# Altium footprint library fszhang.PcbLib: 1032 footprints (part 61 of 66)
Each footprint in its own frame and in the unit in brackets; x right, y up, seen from the top. Pads: shape width x height; smd on the part's side, far side on the other; paste and mask are expansions set on the pad; w line width, h text height; cw(c..) or ccw(c..) is an arc to the next point about the centre after c.
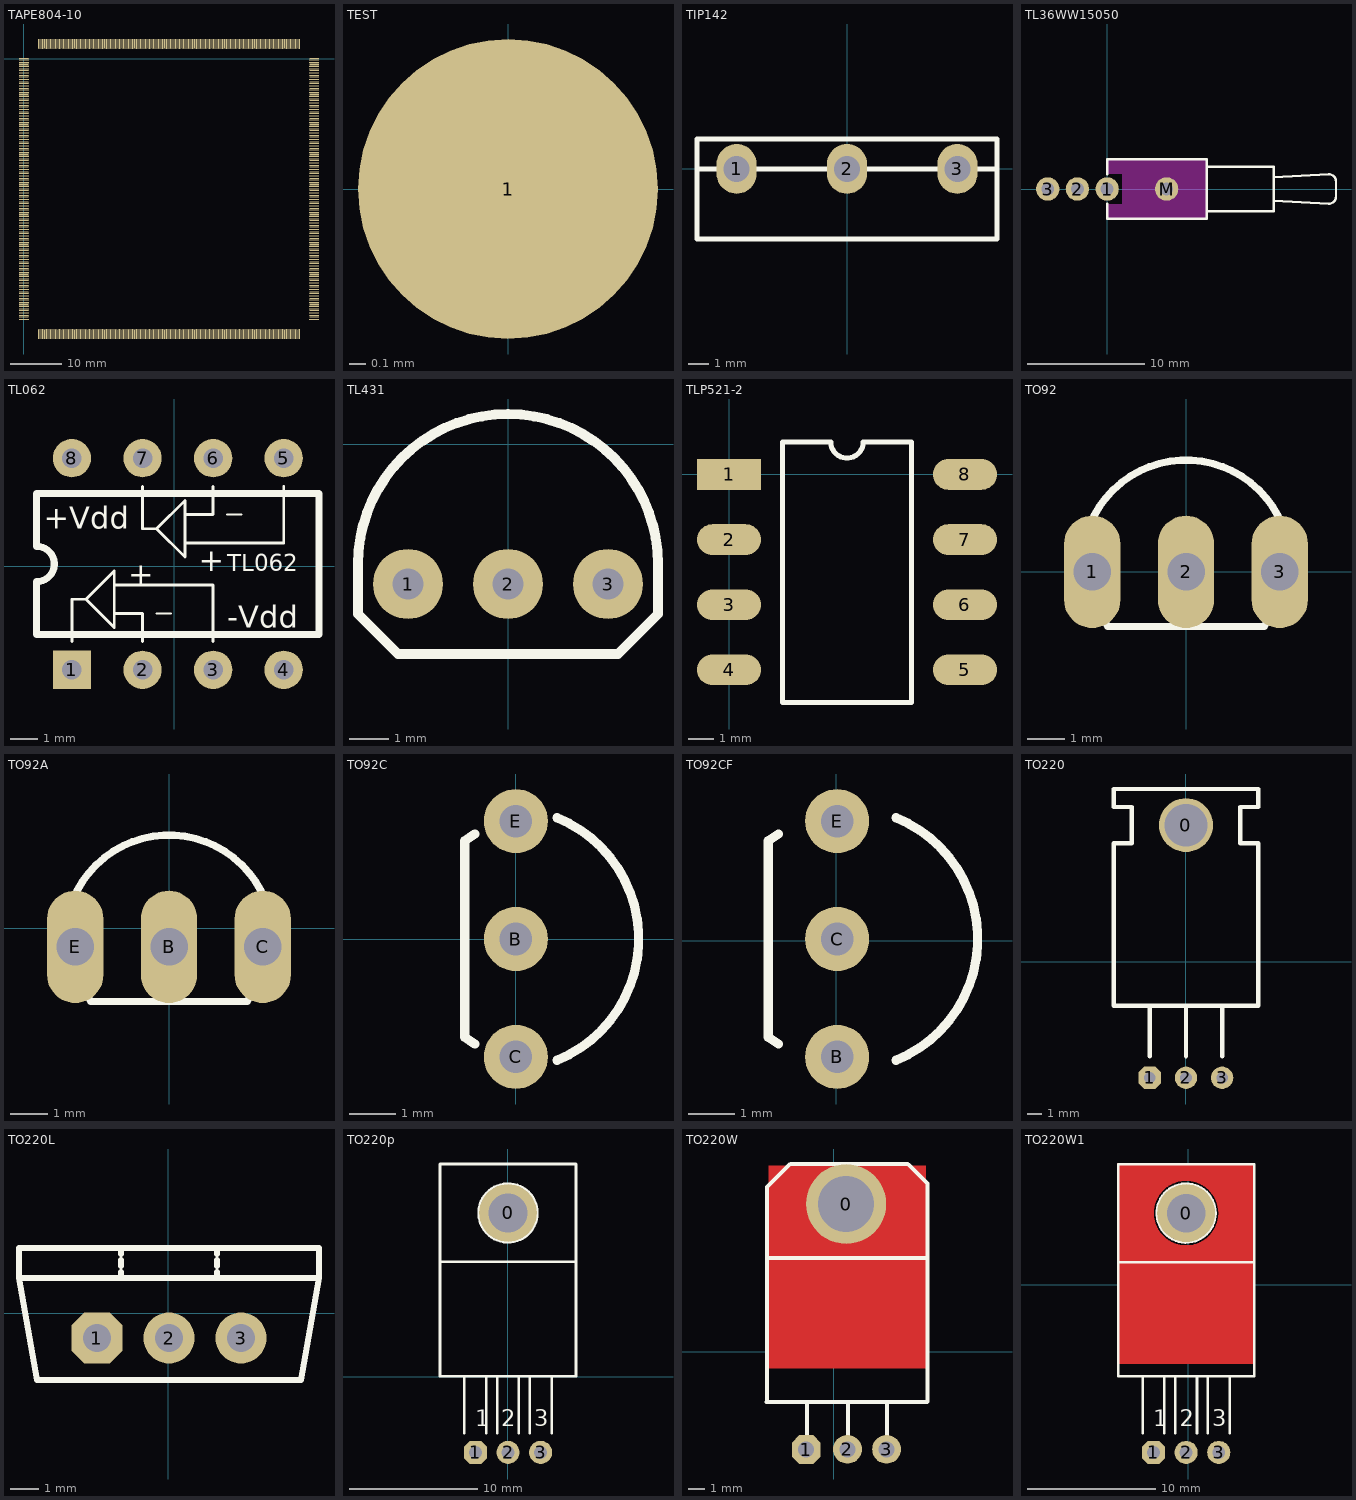
[diagram p60: the footprints below, top view; thin cyan lines are the x and y axes]

## TAPE804-10 [mil]
pads (804):
  oval 75x5 smd: 1(0,0) 2(0,-10) 3(0,-20) 4(0,-30) 5(0,-40) 6(0,-50) 7(0,-60) 8(0,-70) 9(0,-80) 10(0,-90) 11(0,-100) 12(0,-110) 13(0,-120) 14(0,-130) 15(0,-140) 16(0,-150) 17(0,-160) 18(0,-170) 19(0,-180) 20(0,-190) 21(0,-200) 22(0,-210) 23(0,-220) 24(0,-230) 25(0,-240) 26(0,-250) 27(0,-260) 28(0,-270) 29(0,-280) 30(0,-290) 31(0,-300) 32(0,-310) 33(0,-320) 34(0,-330) 35(0,-340) 36(0,-350) 37(0,-360) 38(0,-370) 39(0,-380) 40(0,-390) 41(0,-400) 42(0,-410) 43(0,-420) 44(0,-430) 45(0,-440) 46(0,-450) 47(0,-460) 48(0,-470) 49(0,-480) 50(0,-490) 51(0,-500) 52(0,-510) 53(0,-520) 54(0,-530) 55(0,-540) 56(0,-550) 57(0,-560) 58(0,-570) 59(0,-580) 60(0,-590) 61(0,-600) 62(0,-610) 63(0,-620) 64(0,-630) 65(0,-640) 66(0,-650) 67(0,-660) 68(0,-670) 69(0,-680) 70(0,-690) 71(0,-700) 72(0,-710) 73(0,-720) 74(0,-730) 75(0,-740) 76(0,-750) 77(0,-760) 78(0,-770) 79(0,-780) 80(0,-790) 81(0,-800) 82(0,-810) 83(0,-820) 84(0,-830) 85(0,-840) 86(0,-850) 87(0,-860) 88(0,-870) 89(0,-880) 90(0,-890) 91(0,-900) 92(0,-910) 93(0,-920) 94(0,-930) 95(0,-940) 96(0,-950) 97(0,-960) 98(0,-970) 99(0,-980) 100(0,-990) 101(0,-1000) 102(0,-1010) 103(0,-1020) 104(0,-1030) 105(0,-1040) 106(0,-1050) 107(0,-1060) 108(0,-1070) 109(0,-1080) 110(0,-1090) 111(0,-1100) 112(0,-1110) 113(0,-1120) 114(0,-1130) 115(0,-1140) 116(0,-1150) 117(0,-1160) 118(0,-1170) 119(0,-1180) 120(0,-1190) 121(0,-1200) 122(0,-1210) 123(0,-1220) 124(0,-1230) 125(0,-1240) 126(0,-1250) 127(0,-1260) 128(0,-1270) 129(0,-1280) 130(0,-1290) 131(0,-1300) 132(0,-1310) 133(0,-1320) 134(0,-1330) 135(0,-1340) 136(0,-1350) 137(0,-1360) 138(0,-1370) 139(0,-1380) 140(0,-1390) 141(0,-1400) 142(0,-1410) 143(0,-1420) 144(0,-1430) 145(0,-1440) 146(0,-1450) 147(0,-1460) 148(0,-1470) 149(0,-1480) 150(0,-1490) 151(0,-1500) 152(0,-1510) 153(0,-1520) 154(0,-1530) 155(0,-1540) 156(0,-1550) 157(0,-1560) 158(0,-1570) 159(0,-1580) 160(0,-1590) 161(0,-1600) 162(0,-1610) 163(0,-1620) 164(0,-1630) 165(0,-1640) 166(0,-1650) 167(0,-1660) 168(0,-1670) 169(0,-1680) 170(0,-1690) 171(0,-1700) 172(0,-1710) 173(0,-1720) 174(0,-1730) 175(0,-1740) 176(0,-1750) 177(0,-1760) 178(0,-1770) 179(0,-1780) 180(0,-1790) 181(0,-1800) 182(0,-1810) 183(0,-1820) 184(0,-1830) 185(0,-1840) 186(0,-1850) 187(0,-1860) 188(0,-1870) 189(0,-1880) 190(0,-1890) 191(0,-1900) 192(0,-1910) 193(0,-1920) 194(0,-1930) 195(0,-1940) 196(0,-1950) 197(0,-1960) 198(0,-1970) 199(0,-1980) 200(0,-1990) 201(0,-2000) 403(2225,-2000) 404(2225,-1990) 405(2225,-1980) 406(2225,-1970) 407(2225,-1960) 408(2225,-1950) 409(2225,-1940) 410(2225,-1930) 411(2225,-1920) 412(2225,-1910) 413(2225,-1900) 414(2225,-1890) 415(2225,-1880) 416(2225,-1870) 417(2225,-1860) 418(2225,-1850) 419(2225,-1840) 420(2225,-1830) 421(2225,-1820) 422(2225,-1810) 423(2225,-1800) 424(2225,-1790) 425(2225,-1780) 426(2225,-1770) 427(2225,-1760) 428(2225,-1750) 429(2225,-1740) 430(2225,-1730) 431(2225,-1720) 432(2225,-1710) 433(2225,-1700) 434(2225,-1690) 435(2225,-1680) 436(2225,-1670) 437(2225,-1660) 438(2225,-1650) 439(2225,-1640) 440(2225,-1630) 441(2225,-1620) 442(2225,-1610) 443(2225,-1600) 444(2225,-1590) 445(2225,-1580) 446(2225,-1570) 447(2225,-1560) 448(2225,-1550) 449(2225,-1540) 450(2225,-1530) 451(2225,-1520) 452(2225,-1510) 453(2225,-1500) 454(2225,-1490) 455(2225,-1480) 456(2225,-1470) 457(2225,-1460) 458(2225,-1450) 459(2225,-1440) 460(2225,-1430) 461(2225,-1420) 462(2225,-1410) 463(2225,-1400) 464(2225,-1390) 465(2225,-1380) 466(2225,-1370) 467(2225,-1360) 468(2225,-1350) 469(2225,-1340) 470(2225,-1330) 471(2225,-1320) 472(2225,-1310) 473(2225,-1300) 474(2225,-1290) 475(2225,-1280) 476(2225,-1270) 477(2225,-1260) 478(2225,-1250) 479(2225,-1240) 480(2225,-1230) 481(2225,-1220) 482(2225,-1210) 483(2225,-1200) 484(2225,-1190) 485(2225,-1180) 486(2225,-1170) 487(2225,-1160) 488(2225,-1150) 489(2225,-1140) 490(2225,-1130) 491(2225,-1120) 492(2225,-1110) 493(2225,-1100) 494(2225,-1090) 495(2225,-1080) 496(2225,-1070) 497(2225,-1060) 498(2225,-1050) 499(2225,-1040) 500(2225,-1030) 501(2225,-1020) 502(2225,-1010) 503(2225,-1000) 504(2225,-990) 505(2225,-980) 506(2225,-970) 507(2225,-960) 508(2225,-950) 509(2225,-940) 510(2225,-930) 511(2225,-920) 512(2225,-910) 513(2225,-900) 514(2225,-890) 515(2225,-880) 516(2225,-870) 517(2225,-860) 518(2225,-850) 519(2225,-840) 520(2225,-830) 521(2225,-820) 522(2225,-810) 523(2225,-800) 524(2225,-790) 525(2225,-780) 526(2225,-770) 527(2225,-760) 528(2225,-750) 529(2225,-740) 530(2225,-730) 531(2225,-720) 532(2225,-710) 533(2225,-700) 534(2225,-690) 535(2225,-680) 536(2225,-670) 537(2225,-660) 538(2225,-650) 539(2225,-640) 540(2225,-630) 541(2225,-620) 542(2225,-610) 543(2225,-600) 544(2225,-590) 545(2225,-580) 546(2225,-570) 547(2225,-560) 548(2225,-550) 549(2225,-540) 550(2225,-530) 551(2225,-520) 552(2225,-510) 553(2225,-500) 554(2225,-490) 555(2225,-480) 556(2225,-470) 557(2225,-460) 558(2225,-450) 559(2225,-440) 560(2225,-430) 561(2225,-420) 562(2225,-410) 563(2225,-400) 564(2225,-390) 565(2225,-380) 566(2225,-370) 567(2225,-360) 568(2225,-350) 569(2225,-340) 570(2225,-330) 571(2225,-320) 572(2225,-310) 573(2225,-300) 574(2225,-290) 575(2225,-280) 576(2225,-270) 577(2225,-260) 578(2225,-250) 579(2225,-240) 580(2225,-230) 581(2225,-220) 582(2225,-210) 583(2225,-200) 584(2225,-190) 585(2225,-180) 586(2225,-170) 587(2225,-160) 588(2225,-150) 589(2225,-140) 590(2225,-130) 591(2225,-120) 592(2225,-110) 593(2225,-100) 594(2225,-90) 595(2225,-80) 596(2225,-70) 597(2225,-60) 598(2225,-50) 599(2225,-40) 600(2225,-30) 601(2225,-20) 602(2225,-10) 603(2225,0)
  oval 5x75 smd: 202(113,-2112) 203(123,-2112) 204(133,-2112) 205(143,-2112) 206(153,-2112) 207(163,-2112) 208(173,-2112) 209(183,-2112) 210(193,-2112) 211(203,-2112) 212(213,-2112) 213(223,-2112) 214(233,-2112) 215(243,-2112) 216(253,-2112) 217(263,-2112) 218(273,-2112) 219(283,-2112) 220(293,-2112) 221(303,-2112) 222(313,-2112) 223(323,-2112) 224(333,-2112) 225(343,-2112) 226(353,-2112) 227(363,-2112) 228(373,-2112) 229(383,-2112) 230(393,-2112) 231(403,-2112) 232(413,-2112) 233(423,-2112) 234(433,-2112) 235(443,-2112) 236(453,-2112) 237(463,-2112) 238(473,-2112) 239(483,-2112) 240(493,-2112) 241(503,-2112) 242(513,-2112) 243(523,-2112) 244(533,-2112) 245(543,-2112) 246(553,-2112) 247(563,-2112) 248(573,-2112) 249(583,-2112) 250(593,-2112) 251(603,-2112) 252(613,-2112) 253(623,-2112) 254(633,-2112) 255(643,-2112) 256(653,-2112) 257(663,-2112) 258(673,-2112) 259(683,-2112) 260(693,-2112) 261(703,-2112) 262(713,-2112) 263(723,-2112) 264(733,-2112) 265(743,-2112) 266(753,-2112) 267(763,-2112) 268(773,-2112) 269(783,-2112) 270(793,-2112) 271(803,-2112) 272(813,-2112) 273(823,-2112) 274(833,-2112) 275(843,-2112) 276(853,-2112) 277(863,-2112) 278(873,-2112) 279(883,-2112) 280(893,-2112) 281(903,-2112) 282(913,-2112) 283(923,-2112) 284(933,-2112) 285(943,-2112) 286(953,-2112) 287(963,-2112) 288(973,-2112) 289(983,-2112) 290(993,-2112) 291(1003,-2112) 292(1013,-2112) 293(1023,-2112) 294(1033,-2112) 295(1043,-2112) 296(1053,-2112) 297(1063,-2112) 298(1073,-2112) 299(1083,-2112) 300(1093,-2112) 301(1103,-2112) 302(1113,-2112) 303(1123,-2112) 304(1133,-2112) 305(1143,-2112) 306(1153,-2112) 307(1163,-2112) 308(1173,-2112) 309(1183,-2112) 310(1193,-2112) 311(1203,-2112) 312(1213,-2112) 313(1223,-2112) 314(1233,-2112) 315(1243,-2112) 316(1253,-2112) 317(1263,-2112) 318(1273,-2112) 319(1283,-2112) 320(1293,-2112) 321(1303,-2112) 322(1313,-2112) 323(1323,-2112) 324(1333,-2112) 325(1343,-2112) 326(1353,-2112) 327(1363,-2112) 328(1373,-2112) 329(1383,-2112) 330(1393,-2112) 331(1403,-2112) 332(1413,-2112) 333(1423,-2112) 334(1433,-2112) 335(1443,-2112) 336(1453,-2112) 337(1463,-2112) 338(1473,-2112) 339(1483,-2112) 340(1493,-2112) 341(1503,-2112) 342(1513,-2112) 343(1523,-2112) 344(1533,-2112) 345(1543,-2112) 346(1553,-2112) 347(1563,-2112) 348(1573,-2112) 349(1583,-2112) 350(1593,-2112) 351(1603,-2112) 352(1613,-2112) 353(1623,-2112) 354(1633,-2112) 355(1643,-2112) 356(1653,-2112) 357(1663,-2112) 358(1673,-2112) 359(1683,-2112) 360(1693,-2112) 361(1703,-2112) 362(1713,-2112) 363(1723,-2112) 364(1733,-2112) 365(1743,-2112) 366(1753,-2112) 367(1763,-2112) 368(1773,-2112) 369(1783,-2112) 370(1793,-2112) 371(1803,-2112) 372(1813,-2112) 373(1823,-2112) 374(1833,-2112) 375(1843,-2112) 376(1853,-2112) 377(1863,-2112) 378(1873,-2112) 379(1883,-2112) 380(1893,-2112) 381(1903,-2112) 382(1913,-2112) 383(1923,-2112) 384(1933,-2112) 385(1943,-2112) 386(1953,-2112) 387(1963,-2112) 388(1973,-2112) 389(1983,-2112) 390(1993,-2112) 391(2003,-2112) 392(2013,-2112) 393(2023,-2112) 394(2033,-2112) 395(2043,-2112) 396(2053,-2112) 397(2063,-2112) 398(2073,-2112) 399(2083,-2112) 400(2093,-2112) 401(2103,-2112) 402(2113,-2112) 604(2113,113) 605(2103,113) 606(2093,113) 607(2083,113) 608(2073,113) 609(2063,113) 610(2053,113) 611(2043,113) 612(2033,113) 613(2023,113) 614(2013,113) 615(2003,113) 616(1993,113) 617(1983,113) 618(1973,113) 619(1963,113) 620(1953,113) 621(1943,113) 622(1933,113) 623(1923,113) 624(1913,113) 625(1903,113) 626(1893,113) 627(1883,113) 628(1873,113) 629(1863,113) 630(1853,113) 631(1843,113) 632(1833,113) 633(1823,113) 634(1813,113) 635(1803,113) 636(1793,113) 637(1783,113) 638(1773,113) 639(1763,113) 640(1753,113) 641(1743,113) 642(1733,113) 643(1723,113) 644(1713,113) 645(1703,113) 646(1693,113) 647(1683,113) 648(1673,113) 649(1663,113) 650(1653,113) 651(1643,113) 652(1633,113) 653(1623,113) 654(1613,113) 655(1603,113) 656(1593,113) 657(1583,113) 658(1573,113) 659(1563,113) 660(1553,113) 661(1543,113) 662(1533,113) 663(1523,113) 664(1513,113) 665(1503,113) 666(1493,113) 667(1483,113) 668(1473,113) 669(1463,113) 670(1453,113) 671(1443,113) 672(1433,113) 673(1423,113) 674(1413,113) 675(1403,113) 676(1393,113) 677(1383,113) 678(1373,113) 679(1363,113) 680(1353,113) 681(1343,113) 682(1333,113) 683(1323,113) 684(1313,113) 685(1303,113) 686(1293,113) 687(1283,113) 688(1273,113) 689(1263,113) 690(1253,113) 691(1243,113) 692(1233,113) 693(1223,113) 694(1213,113) 695(1203,113) 696(1193,113) 697(1183,113) 698(1173,113) 699(1163,113) 700(1153,113) 701(1143,113) 702(1133,113) 703(1123,113) 704(1113,113) 705(1103,113) 706(1093,113) 707(1083,113) 708(1073,113) 709(1063,113) 710(1053,113) 711(1043,113) 712(1033,113) 713(1023,113) 714(1013,113) 715(1003,113) 716(993,113) 717(983,113) 718(973,113) 719(963,113) 720(953,113) 721(943,113) 722(933,113) 723(923,113) 724(913,113) 725(903,113) 726(893,113) 727(883,113) 728(873,113) 729(863,113) 730(853,113) 731(843,113) 732(833,113) 733(823,113) 734(813,113) 735(803,113) 736(793,113) 737(783,113) 738(773,113) 739(763,113) 740(753,113) 741(743,113) 742(733,113) 743(723,113) 744(713,113) 745(703,113) 746(693,113) 747(683,113) 748(673,113) 749(663,113) 750(653,113) 751(643,113) 752(633,113) 753(623,113) 754(613,113) 755(603,113) 756(593,113) 757(583,113) 758(573,113) 759(563,113) 760(553,113) 761(543,113) 762(533,113) 763(523,113) 764(513,113) 765(503,113) 766(493,113) 767(483,113) 768(473,113) 769(463,113) 770(453,113) 771(443,113) 772(433,113) 773(423,113) 774(413,113) 775(403,113) 776(393,113) 777(383,113) 778(373,113) 779(363,113) 780(353,113) 781(343,113) 782(333,113) 783(323,113) 784(313,113) 785(303,113) 786(293,113) 787(283,113) 788(273,113) 789(263,113) 790(253,113) 791(243,113) 792(233,113) 793(223,113) 794(213,113) 795(203,113) 796(193,113) 797(183,113) 798(173,113) 799(163,113) 800(153,113) 801(143,113) 802(133,113) 803(123,113) 804(113,113)

## TEST [mil]
pads (1):
  round 70 smd: 1(0,0)

## TIP142 [mil]
pads (3):
  oval 79x98 hole 51: 1(-217,0) 2(0,0) 3(217,0)
Top Overlay:
  lines w10: -295,0 295,0 ; -295,-138 -295,59 295,59 295,-138 -295,-138

## TL36WW15050 [mm] "SPDT Subminiature Toggle Switch, Right Angle Mounting, Vertical Actuation"
pads (4):
  round 2 hole 1.1: 1(0,0) 2(-2.54,0) 3(-5.08,0) M(5.08,0)
Top Layer keep-out:
  region: 1.27,2.54 1.27,-2.54 8.509,-2.54 8.509,2.54
  region: 0,2.54 0,1.27 1.27,1.27 1.27,2.54
  region: 0,-1.27 0,-2.54 1.27,-2.54 1.27,-1.27
Top Overlay:
  lines w0.2: 0,-1.27 0,-2.54 8.509,-2.54 8.509,2.54 0,2.54 0,1.27 ; 8.509,-1.905 14.224,-1.905 14.224,1.905 8.509,1.905 ; 14.224,-1.016 18.923,-1.27 ccw(c18.923,-0.635) 19.558,-0.635 19.558,0.635 ccw(c18.923,0.635) 18.923,1.27 14.224,1.016

## TL062 [mm]
pads (8):
  rect 1.38x1.38 hole 0.7: 1(-3.676,-3.723)
  round 1.38 hole 0.7: 2(-1.136,-3.723) 3(1.404,-3.723) 4(3.944,-3.723) 5(3.944,3.897) 6(1.404,3.897) 7(-1.136,3.897) 8(-3.676,3.897)
Top Overlay:
  lines w0.081: -0.628,-1.691 -0.12,-1.691 ; 1.912,1.865 2.42,1.865
  lines w0.103: -3.676,-2.707 -3.676,-1.183 -3.168,-1.183 ; -2.152,-1.691 -1.136,-1.691 -1.136,-2.707 ; -2.152,-0.675 1.404,-0.675 1.404,-2.707 ; -1.136,2.881 -1.136,1.357 -0.628,1.357 ; 0.388,0.849 3.944,0.849 3.944,2.881 ; 0.388,1.865 1.404,1.865 1.404,2.881 ; -3.168,-1.183 -2.152,-0.167 -2.152,-2.199 -3.168,-1.183 ; -0.628,1.357 0.388,2.373 0.388,0.341 -0.628,1.357
  lines w0.254: -4.946,-2.453 5.214,-2.453 5.214,2.627 -4.946,2.627 -4.946,0.722 cw(c-4.946,0.087) -4.946,-0.548 -4.946,-2.453
  text "-Vdd" at 1.912,-2.199 h0.8
  text "+Vdd" at -4.692,1.357 h0.8
  text "+" at -1.644,-0.675 h0.8
  text "+" at 0.896,-0.167 h0.8
  text "TL062" at 1.912,-0.167 h0.6

## TL431 [mil]
pads (3):
  round 70 hole 31.5: 1(-100,-140) 2(0,-140) 3(100,-140)
Top Overlay:
  lines w10: -150,-170 -150,-120 cw(c0,-120) 150,-120 150,-170 110,-210 -110,-210 -150,-170

## TLP521-2 [mm]
pads (8):
  rect 2.5x1.2 smd: 1(0,0)
  oval 2.5x1.2 smd: 2(0,-2.54) 3(0,-5.08) 4(0,-7.62) 5(9.2,-7.62) 6(9.2,-5.08) 7(9.2,-2.54) 8(9.2,0)
Top Overlay:
  lines w0.2: 2.085,-8.89 2.085,1.27 3.965,1.27 ccw(c4.6,1.27) 5.235,1.27 7.115,1.27 7.115,-8.89 2.085,-8.89

## TO92 [mil]
pads (3):
  oval 60x120 hole 40: 1(-100,0) 2(0,0) 3(100,0)
Top Overlay:
  lines w7.87: -102.76,49.85 cw(c0,8.33) 102.76,49.85 ; -89.08,-49.71 -83.33,-58.33 83.33,-58.33 89.08,-49.71

## TO92A [mil]
pads (3):
  oval 60x120 hole 40: B(0,-20) C(100,-20) E(-100,-20)
Top Overlay:
  lines w7.87: -102.76,29.85 cw(c0,-11.67) 102.76,29.85 ; -89.08,-69.71 -83.33,-78.33 83.33,-78.33 89.08,-69.71

## TO92C [mm]
pads (3):
  round 1.38 hole 0.7: B(0,0) C(0,-2.54) E(0,2.54)
Top Overlay:
  lines w0.2: -0.882,-2.263 -1.101,-2.117 -1.101,2.117 -0.882,2.263 ; 0.885,-2.61 ccw(c-0.169,0) 0.885,2.61

## TO92CF [mm]
pads (3):
  round 1.38 hole 0.7: B(0.02,-2.5) C(0.02,0.04) E(0.02,2.58)
Top Overlay:
  lines w0.2: -1.243,-2.223 -1.462,-2.077 -1.462,2.157 -1.243,2.303 ; 1.286,-2.57 ccw(c0.232,0.04) 1.286,2.65

## TO220 [mil]
pads (4):
  round 149.61 hole 118.11: 0(0.87,378.82)
  oct 62x62 hole 32: 1(-99.13,-321.18)
  round 62 hole 32: 2(0.87,-321.18) 3(100.87,-321.18)
Top Overlay:
  lines w12: -99.13,-261.18 -99.13,-121.18 ; 0.87,-261.18 0.87,-121.18 ; 100.87,-261.18 100.87,-121.18 ; -199.13,-121.18 -199.13,328.82 -149.13,328.82 -149.13,428.82 -199.13,428.82 -199.13,478.82 200.87,478.82 200.87,428.82 150.87,428.82 150.87,328.82 200.87,328.82 200.87,-121.18 -199.13,-121.18

## TO220L [mm]
pads (3):
  oct 1.8x1.8 hole 1: 1(-2.514,-0.876)
  round 1.8 hole 1: 2(0.026,-0.876) 3(2.566,-0.876)
Top Overlay:
  lines w0.2: -1.667,1.241 -1.667,1.452 ; -1.667,1.664 -1.667,1.876 ; -1.667,2.087 -1.667,2.299 ; 1.719,1.241 1.719,1.452 ; 1.719,1.664 1.719,1.876 ; 1.719,2.087 1.719,2.299 ; -5.266,1.241 -5.266,2.299 5.318,2.299 5.318,1.241 ; -5.266,1.241 -4.631,-2.358 4.683,-2.358 5.318,1.241 ; -5.266,1.241 5.318,1.241

## TO220p [mm]
pads (4):
  round 4.5 hole 3: 0(0.026,12.739)
  oct 1.8x1.8 hole 1: 1(-2.514,-5.888)
  round 1.8 hole 1: 2(0.026,-5.888) 3(2.566,-5.888)
Top Overlay:
  circle w0.203: c0.026,12.739 r2.286
  lines w0.2: -5.266,8.929 5.318,8.929 ; -3.361,-4.406 -3.361,0.039 ; -1.667,-4.406 -1.667,0.039 ; -0.821,-4.406 -0.821,0.039 ; 0.873,-4.406 0.873,0.039 ; 1.719,-4.406 1.719,0.039 ; 3.413,-4.406 3.413,0.039 ; -5.266,0.039 -5.266,16.549 5.318,16.549 5.318,0.039 -5.266,0.039
  text "3" at 2.058,-3.856 h1.27
  text "2" at -0.482,-3.856 h1.27
  text "1" at -2.514,-3.856 h1.27

## TO220W [mm]
pads (4):
  round 5 hole 3.5: 0(0.78,9.22)
  oct 1.8x1.8 hole 1: 1(-1.72,-6.12)
  round 1.8 hole 1: 2(0.86,-6.1) 3(3.3,-6.1)
Top Layer:
  rectangle: -4.08,-1.04 5.76,11.64
Top Overlay:
  lines w0.254: -4.2,-3.14 5.84,-3.14 ; -4.18,-3.08 -4.18,9.9 ; -4.18,5.86 5.84,5.86 ; -4.18,9.78 -4.18,10.28 ; -4.14,10.3 -2.76,11.68 ; -2.68,11.72 4.6,11.72 ; -1.66,-5.7 -1.66,-3.16 ; 0.9,-5.78 0.9,-3.2 ; 3.34,-5.72 3.34,-3.2 ; 4.7,11.66 5.86,10.5 5.86,9.72 ; 5.86,-3.12 5.86,9.78
Top Paste:
  rectangle: -4.06,-0.96 5.72,11.54

## TO220W1 [mm]
pads (4):
  round 4.5 hole 3: 0(-0.177,5.576)
  oct 1.8x1.8 hole 1: 1(-2.717,-13.051)
  round 1.8 hole 1: 2(-0.177,-13.051) 3(2.363,-13.051)
Top Layer:
  circle w0.16: c-0.177,5.576 r2.584
  lines w0.16: -5.486,-6.04 5.08,-6.04 ; -5.486,-5.88 5.08,-5.88 ; -5.486,-5.72 5.08,-5.72 ; -5.486,-5.56 5.08,-5.56 ; -5.486,-5.4 5.08,-5.4 ; -5.486,-5.24 5.08,-5.24 ; -5.486,-5.08 5.08,-5.08 ; -5.486,-4.92 5.08,-4.92 ; -5.486,-4.76 5.08,-4.76 ; -5.486,-4.6 5.08,-4.6 ; -5.486,-4.44 5.08,-4.44 ; -5.486,-4.28 5.08,-4.28 ; -5.486,-4.12 5.08,-4.12 ; -5.486,-3.96 5.08,-3.96 ; -5.486,-3.8 5.08,-3.8 ; -5.486,-3.64 5.08,-3.64 ; -5.486,-3.48 5.08,-3.48 ; -5.486,-3.32 5.08,-3.32 ; -5.486,-3.16 5.08,-3.16 ; -5.486,-3 5.08,-3 ; -5.486,-2.84 5.08,-2.84 ; -5.486,-2.68 5.08,-2.68 ; -5.486,-2.52 5.08,-2.52 ; -5.486,-2.36 5.08,-2.36 ; -5.486,-2.2 5.08,-2.2 ; -5.486,-2.04 5.08,-2.04 ; -5.486,-1.88 5.08,-1.88 ; -5.486,-1.72 5.08,-1.72 ; -5.486,-1.56 5.08,-1.56 ; -5.486,-1.4 5.08,-1.4 ; -5.486,-1.24 5.08,-1.24 ; -5.486,-1.08 5.08,-1.08 ; -5.486,-0.92 5.08,-0.92 ; -5.486,-0.76 5.08,-0.76 ; -5.486,-0.6 5.08,-0.6 ; -5.486,-0.44 5.08,-0.44 ; -5.486,-0.28 5.08,-0.28 ; -5.486,-0.12 5.08,-0.12 ; -5.486,0.04 5.08,0.04 ; -5.486,0.2 5.08,0.2 ; -5.486,0.36 5.08,0.36 ; -5.486,0.52 5.08,0.52 ; -5.486,0.68 5.08,0.68 ; -5.486,0.84 5.08,0.84 ; -5.486,1 5.08,1 ; -5.486,1.16 5.08,1.16 ; -5.486,1.32 5.08,1.32 ; -5.486,1.48 5.08,1.48 ; -5.486,1.64 5.08,1.64 ; -5.486,1.8 5.08,1.8 ; -5.486,1.96 5.08,1.96 ; -5.486,2.12 5.08,2.12 ; -5.486,2.28 5.08,2.28 ; -5.486,2.44 5.08,2.44 ; -5.486,2.6 5.08,2.6 ; -5.486,2.76 5.08,2.76 ; -5.486,2.92 5.08,2.92 ; -5.486,3.08 -0.846,3.08 ; -5.486,3.24 -1.282,3.24 ; -5.486,3.4 -1.571,3.4 ; -5.486,3.56 -1.794,3.56 ; -5.486,3.72 -1.975,3.72 ; -5.486,3.88 -2.127,3.88 ; -5.486,4.04 -2.255,4.04 ; -5.486,4.2 -2.364,4.2 ; -5.486,4.36 -2.457,4.36 ; -5.486,4.52 -2.536,4.52 ; -5.486,4.68 -2.601,4.68 ; -5.486,4.84 -2.654,4.84 ; -5.486,5 -2.696,5 ; -5.486,5.16 -2.728,5.16 ; -5.486,5.32 -2.748,5.32 ; -5.486,5.48 -2.759,5.48 ; -5.486,5.64 -2.76,5.64 ; -5.486,5.8 -2.751,5.8 ; -5.486,5.96 -2.733,5.96 ; -5.486,6.12 -2.703,6.12 ; -5.486,6.28 -2.663,6.28 ; -5.486,6.44 -2.612,6.44 ; -5.486,6.6 -2.55,6.6 ; -5.486,6.76 -2.474,6.76 ; -5.486,6.92 -2.384,6.92 ; -5.486,7.08 -2.278,7.08 ; -5.486,7.24 -2.154,7.24 ; -5.486,7.4 -2.007,7.4 ; -5.486,7.56 -1.833,7.56 ; -5.486,7.72 -1.619,7.72 ; -5.486,7.88 -1.347,7.88 ; -5.486,8.04 -0.955,8.04 ; -5.486,8.2 5.08,8.2 ; -5.486,8.36 5.08,8.36 ; -5.486,8.52 5.08,8.52 ; -5.486,8.68 5.08,8.68 ; -5.486,8.84 5.08,8.84 ; -5.486,9 5.08,9 ; -5.486,9.16 5.08,9.16 ; -5.486,9.32 5.08,9.32 ; -5.484,-6.096 -5.484,9.398 ; -5.324,-6.096 -5.324,9.398 ; -5.164,-6.096 -5.164,9.398 ; -5.004,-6.096 -5.004,9.398 ; -4.844,-6.096 -4.844,9.398 ; -4.684,-6.096 -4.684,9.398 ; -4.524,-6.096 -4.524,9.398 ; -4.364,-6.096 -4.364,9.398 ; -4.204,-6.096 -4.204,9.398 ; -4.044,-6.096 -4.044,9.398 ; -3.884,-6.096 -3.884,9.398 ; -3.724,-6.096 -3.724,9.398 ; -3.564,-6.096 -3.564,9.398 ; -3.404,-6.096 -3.404,9.398 ; -3.244,-6.096 -3.244,9.398 ; -3.084,-6.096 -3.084,9.398 ; -2.924,-6.096 -2.924,9.398 ; -2.764,-6.096 -2.764,9.398 ; -2.604,-6.096 -2.604,4.689 ; -2.604,6.463 -2.604,9.398 ; -2.444,-6.096 -2.444,4.336 ; -2.444,6.816 -2.444,9.398 ; -2.284,-6.096 -2.284,4.08 ; -2.284,7.072 -2.284,9.398 ; -2.124,-6.096 -2.124,3.877 ; -2.124,7.275 -2.124,9.398 ; -1.964,-6.096 -1.964,3.709 ; -1.964,7.442 -1.964,9.398 ; -1.804,-6.096 -1.804,3.568 ; -1.804,7.583 -1.804,9.398 ; -1.644,-6.096 -1.644,3.449 ; -1.644,7.703 -1.644,9.398 ; -1.484,-6.096 -1.484,3.347 ; -1.484,7.805 -1.484,9.398 ; -1.324,-6.096 -1.324,3.26 ; -1.324,7.891 -1.324,9.398 ; -1.164,-6.096 -1.164,3.188 ; -1.164,7.964 -1.164,9.398 ; -1.004,-6.096 -1.004,3.128 ; -1.004,8.024 -1.004,9.398 ; -0.844,-6.096 -0.844,3.079 ; -0.844,8.072 -0.844,9.398 ; -0.684,-6.096 -0.684,3.042 ; -0.684,8.11 -0.684,9.398 ; -0.524,-6.096 -0.524,3.015 ; -0.524,8.136 -0.524,9.398 ; -0.364,-6.096 -0.364,2.999 ; -0.364,8.153 -0.364,9.398 ; -0.204,-6.096 -0.204,2.992 ; -0.204,8.16 -0.204,9.398 ; -0.044,-6.096 -0.044,2.995 ; -0.044,8.156 -0.044,9.398 ; 0.116,-6.096 0.116,3.009 ; 0.116,8.143 0.116,9.398 ; 0.276,-6.096 0.276,3.032 ; 0.276,8.12 0.276,9.398 ; 0.436,-6.096 0.436,3.066 ; 0.436,8.086 0.436,9.398 ; 0.492,3.08 5.08,3.08 ; 0.596,-6.096 0.596,3.11 ; 0.596,8.042 0.596,9.398 ; 0.601,8.04 5.08,8.04 ; 0.756,-6.096 0.756,3.166 ; 0.756,7.986 0.756,9.398 ; 0.916,-6.096 0.916,3.234 ; 0.916,7.917 0.916,9.398 ; 0.928,3.24 5.08,3.24 ; 0.993,7.88 5.08,7.88 ; 1.076,-6.096 1.076,3.316 ; 1.076,7.836 1.076,9.398 ; 1.217,3.4 5.08,3.4 ; 1.236,-6.096 1.236,3.412 ; 1.236,7.739 1.236,9.398 ; 1.265,7.72 5.08,7.72 ; 1.396,-6.096 1.396,3.526 ; 1.396,7.626 1.396,9.398 ; 1.439,3.56 5.08,3.56 ; 1.478,7.56 5.08,7.56 ; 1.556,-6.096 1.556,3.659 ; 1.556,7.493 1.556,9.398 ; 1.621,3.72 5.08,3.72 ; 1.653,7.4 5.08,7.4 ; 1.716,-6.096 1.716,3.817 ; 1.716,7.335 1.716,9.398 ; 1.772,3.88 5.08,3.88 ; 1.8,7.24 5.08,7.24 ; 1.876,-6.096 1.876,4.007 ; 1.876,7.145 1.876,9.398 ; 1.901,4.04 5.08,4.04 ; 1.924,7.08 5.08,7.08 ; 2.01,4.2 5.08,4.2 ; 2.03,6.92 5.08,6.92 ; 2.036,-6.096 2.036,4.242 ; 2.036,6.91 2.036,9.398 ; 2.103,4.36 5.08,4.36 ; 2.12,6.76 5.08,6.76 ; 2.181,4.52 5.08,4.52 ; 2.196,-6.096 2.196,4.553 ; 2.196,6.599 2.196,9.398 ; 2.195,6.6 5.08,6.6 ; 2.247,4.68 5.08,4.68 ; 2.258,6.44 5.08,6.44 ; 2.3,4.84 5.08,4.84 ; 2.309,6.28 5.08,6.28 ; 2.342,5 5.08,5 ; 2.349,6.12 5.08,6.12 ; 2.356,-6.096 2.356,5.065 ; 2.356,6.087 2.356,9.398 ; 2.373,5.16 5.08,5.16 ; 2.378,5.96 5.08,5.96 ; 2.394,5.32 5.08,5.32 ; 2.397,5.8 5.08,5.8 ; 2.405,5.48 5.08,5.48 ; 2.406,5.64 5.08,5.64 ; 2.516,-6.096 2.516,9.398 ; 2.676,-6.096 2.676,9.398 ; 2.836,-6.096 2.836,9.398 ; 2.996,-6.096 2.996,9.398 ; 3.156,-6.096 3.156,9.398 ; 3.316,-6.096 3.316,9.398 ; 3.476,-6.096 3.476,9.398 ; 3.636,-6.096 3.636,9.398 ; 3.796,-6.096 3.796,9.398 ; 3.956,-6.096 3.956,9.398 ; 4.116,-6.096 4.116,9.398 ; 4.276,-6.096 4.276,9.398 ; 4.436,-6.096 4.436,9.398 ; 4.596,-6.096 4.596,9.398 ; 4.756,-6.096 4.756,9.398 ; 4.916,-6.096 4.916,9.398 ; 5.076,-6.096 5.076,9.398 ; -5.486,-6.096 -5.486,9.398 5.08,9.398 5.08,-6.096 -5.486,-6.096
Top Overlay:
  circle w0.203: c-0.177,5.576 r2.286
  lines w0.2: -5.469,1.766 5.114,1.766 ; -3.564,-11.569 -3.564,-7.124 ; -1.871,-11.569 -1.871,-7.124 ; -1.024,-11.569 -1.024,-7.124 ; 0.669,-11.569 0.669,-7.124 ; 1.516,-11.569 1.516,-7.124 ; 3.209,-11.569 3.209,-7.124 ; -5.469,-7.124 -5.469,9.386 5.114,9.386 5.114,-7.124 -5.469,-7.124
  text "3" at 1.855,-11.019 h1.27
  text "2" at -0.685,-11.019 h1.27
  text "1" at -2.717,-11.019 h1.27